# Altium footprint library bethu.PcbLib: 628 footprints (part 15 of 40)
Each footprint in its own frame and in the unit in brackets; x right, y up, seen from the top. Pads: shape width x height; smd on the part's side, far side on the other; paste and mask are expansions set on the pad; w line width, h text height; cw(c..) or ccw(c..) is an arc to the next point about the centre after c.
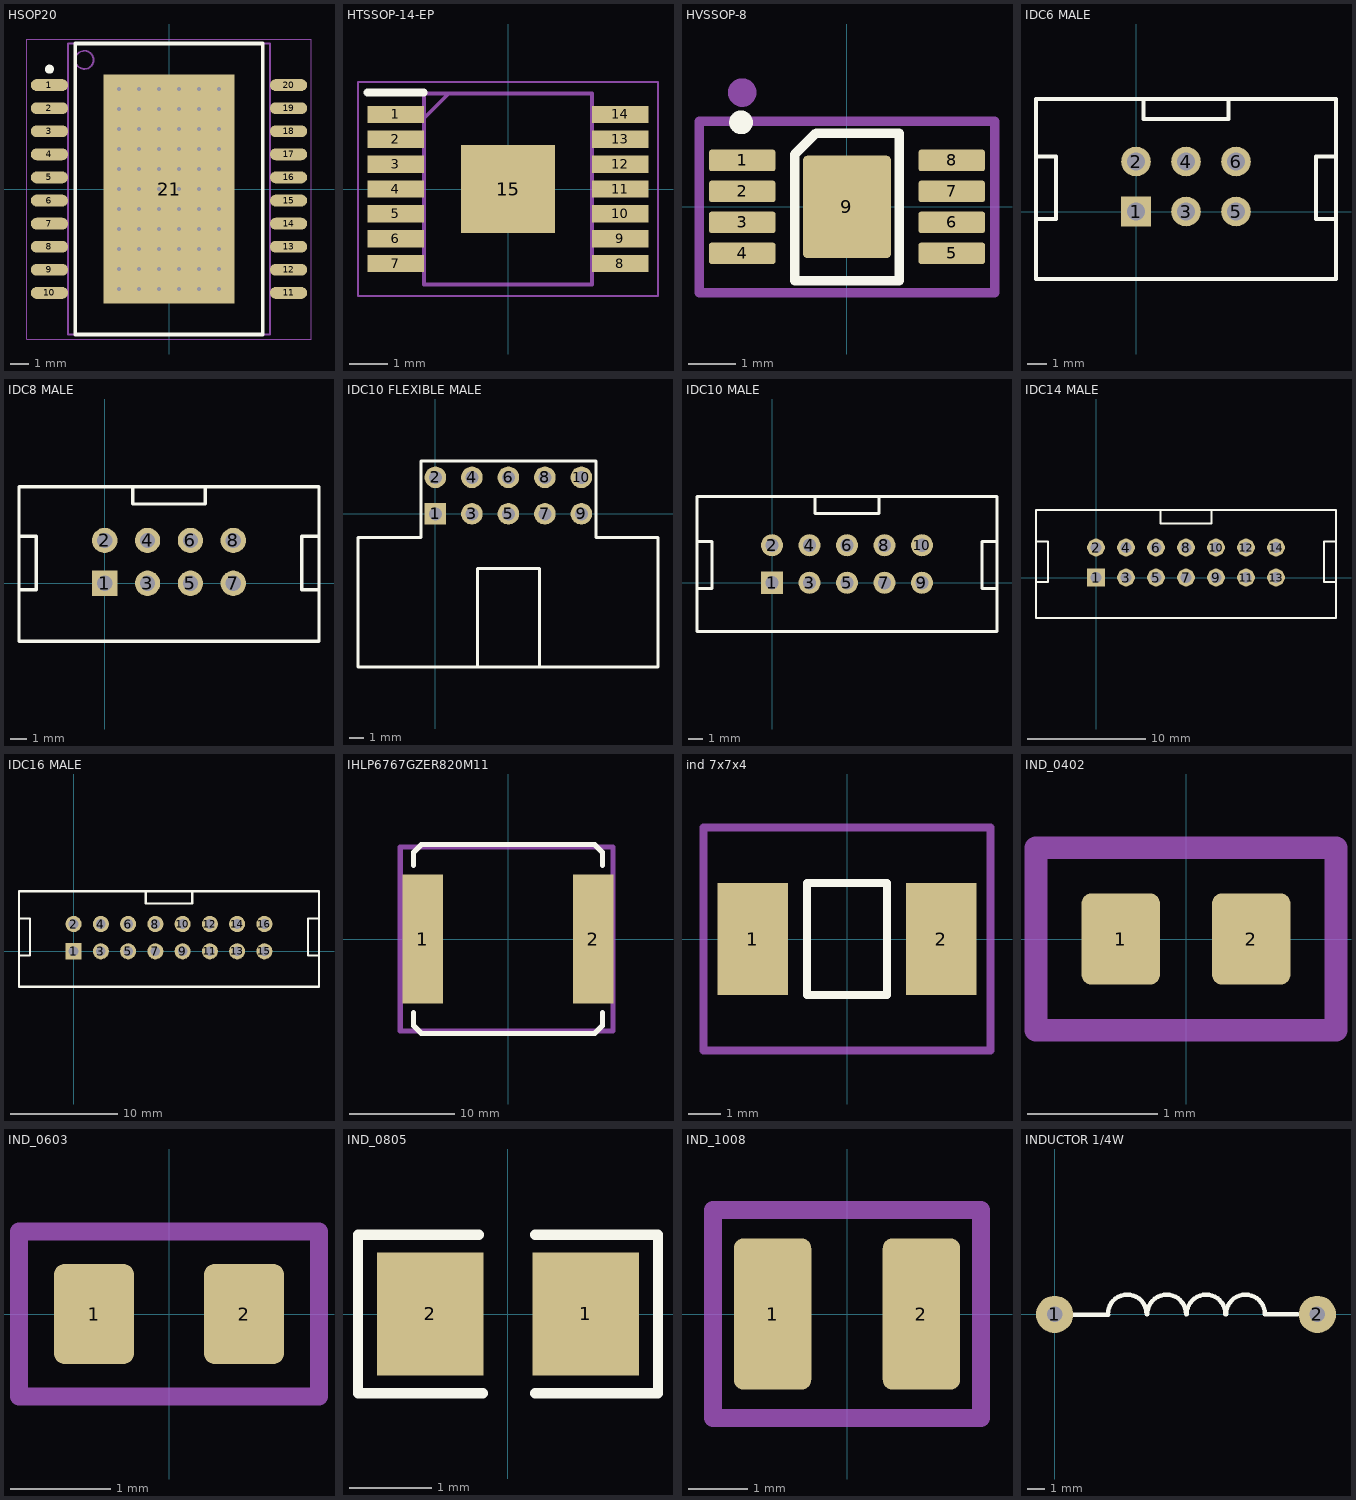
[diagram p14: the footprints below, top view; thin cyan lines are the x and y axes]

## HSOP20 [mm] "SOP, 20-Leads, Body 15.90x11.00mm, Pitch 1.27mm, Thermal Pad 12.60x7.20mm, IPC Medium Density"
height 3.4
pads (21):
  oval 2.05x0.65 smd: 1(-6.575,5.715) 2(-6.575,4.445) 3(-6.575,3.175) 4(-6.575,1.905) 5(-6.575,0.635) 6(-6.575,-0.635) 7(-6.575,-1.905) 8(-6.575,-3.175) 9(-6.575,-4.445) 10(-6.575,-5.715) 11(6.575,-5.715) 12(6.575,-4.445) 13(6.575,-3.175) 14(6.575,-1.905) 15(6.575,-0.635) 16(6.575,0.635) 17(6.575,1.905) 18(6.575,3.175) 19(6.575,4.445) 20(6.575,5.715)
  rect 7.2x12.6 smd: 21(0,0)
via 2.75,-5.5 diameter 0.5 hole 0.2
via 1.65,-5.5 diameter 0.5 hole 0.2
via 0.55,-5.5 diameter 0.5 hole 0.2
via -0.55,-5.5 diameter 0.5 hole 0.2
via -1.65,-5.5 diameter 0.5 hole 0.2
via -2.75,-5.5 diameter 0.5 hole 0.2
via 2.75,-4.4 diameter 0.5 hole 0.2
via 1.65,-4.4 diameter 0.5 hole 0.2
via 0.55,-4.4 diameter 0.5 hole 0.2
via -0.55,-4.4 diameter 0.5 hole 0.2
via -1.65,-4.4 diameter 0.5 hole 0.2
via -2.75,-4.4 diameter 0.5 hole 0.2
via 2.75,-3.3 diameter 0.5 hole 0.2
via 1.65,-3.3 diameter 0.5 hole 0.2
via 0.55,-3.3 diameter 0.5 hole 0.2
via -0.55,-3.3 diameter 0.5 hole 0.2
via -1.65,-3.3 diameter 0.5 hole 0.2
via -2.75,-3.3 diameter 0.5 hole 0.2
via 2.75,-2.2 diameter 0.5 hole 0.2
via 1.65,-2.2 diameter 0.5 hole 0.2
via 0.55,-2.2 diameter 0.5 hole 0.2
via -0.55,-2.2 diameter 0.5 hole 0.2
via -1.65,-2.2 diameter 0.5 hole 0.2
via -2.75,-2.2 diameter 0.5 hole 0.2
via 2.75,-1.1 diameter 0.5 hole 0.2
via 1.65,-1.1 diameter 0.5 hole 0.2
via 0.55,-1.1 diameter 0.5 hole 0.2
via -0.55,-1.1 diameter 0.5 hole 0.2
via -1.65,-1.1 diameter 0.5 hole 0.2
via -2.75,-1.1 diameter 0.5 hole 0.2
via 2.75,0 diameter 0.5 hole 0.2
via 1.65,0 diameter 0.5 hole 0.2
via 0.55,0 diameter 0.5 hole 0.2
via -0.55,0 diameter 0.5 hole 0.2
via -1.65,0 diameter 0.5 hole 0.2
via -2.75,0 diameter 0.5 hole 0.2
via 2.75,1.1 diameter 0.5 hole 0.2
via 1.65,1.1 diameter 0.5 hole 0.2
via 0.55,1.1 diameter 0.5 hole 0.2
via -0.55,1.1 diameter 0.5 hole 0.2
via -1.65,1.1 diameter 0.5 hole 0.2
via -2.75,1.1 diameter 0.5 hole 0.2
via 2.75,2.2 diameter 0.5 hole 0.2
via 1.65,2.2 diameter 0.5 hole 0.2
via 0.55,2.2 diameter 0.5 hole 0.2
via -0.55,2.2 diameter 0.5 hole 0.2
via -1.65,2.2 diameter 0.5 hole 0.2
via -2.75,2.2 diameter 0.5 hole 0.2
via 2.75,3.3 diameter 0.5 hole 0.2
via 1.65,3.3 diameter 0.5 hole 0.2
via 0.55,3.3 diameter 0.5 hole 0.2
via -0.55,3.3 diameter 0.5 hole 0.2
via -1.65,3.3 diameter 0.5 hole 0.2
via -2.75,3.3 diameter 0.5 hole 0.2
via 2.75,4.4 diameter 0.5 hole 0.2
via 1.65,4.4 diameter 0.5 hole 0.2
via 0.55,4.4 diameter 0.5 hole 0.2
via -0.55,4.4 diameter 0.5 hole 0.2
via -1.65,4.4 diameter 0.5 hole 0.2
via -2.75,4.4 diameter 0.5 hole 0.2
via 2.75,5.5 diameter 0.5 hole 0.2
via 1.65,5.5 diameter 0.5 hole 0.2
via 0.55,5.5 diameter 0.5 hole 0.2
via -0.55,5.5 diameter 0.5 hole 0.2
via -1.65,5.5 diameter 0.5 hole 0.2
via -2.75,5.5 diameter 0.5 hole 0.2
Top Overlay:
  circle w0.25: c-6.575,6.59 r0.125
  lines w0.2: -5.15,-8 5.15,-8 5.15,8 -5.15,8 -5.15,-8
Mechanical 13:
  circle w0.1: c-4.65,7.1 r0.5
  lines w0.1: -5.55,-8 5.55,-8 5.55,8 -5.55,8 -5.55,-8
Mechanical 15:
  lines w0.05: -7.825,-8.25 7.825,-8.25 7.825,8.25 -7.825,8.25 -7.825,-8.25
  lines w0.1: -0.5,0 0.5,0 ; 0,-0.5 0,0.5
3D body "User Library-HSOP_20pin_IC-MC33886PVW.STEP": height 3.2, standoff 0, extent -7.125,-8 7.125,8

## HTSSOP-14-EP [mm]
pads (15):
  rect 1.475x0.45 smd: 1(-2.938,1.95) 2(-2.938,1.3) 3(-2.938,0.65) 4(-2.938,0) 5(-2.938,-0.65) 6(-2.938,-1.3) 7(-2.938,-1.95) 8(2.938,-1.95) 9(2.938,-1.3) 10(2.938,-0.65) 11(2.938,0) 12(2.938,0.65) 13(2.938,1.3) 14(2.938,1.95)
  rect 2.46x2.31 smd: 15(0,0)
Top Overlay:
  lines w0.2: -3.675,2.525 -2.2,2.525
Mechanical 13:
  lines w0.1: -2.2,1.85 -1.55,2.5 ; -2.2,-2.5 -2.2,2.5 2.2,2.5 2.2,-2.5 -2.2,-2.5
  text "'.Designator'" at -5.84,-0.925 h1
Mechanical 15:
  lines w0.05: -3.925,-2.8 -3.925,2.8 3.925,2.8 3.925,-2.8 -3.925,-2.8
3D body "TPS54386TPWPRQ1.stp": height 1.13, standoff 0, extent -3.2,-2.5 3.2,2.5

## HVSSOP-8 [mm]
height 1.1
pads (9):
  rrect25% 1.4x0.45 smd: 1(-2.2,0.975) 2(-2.2,0.325) 3(-2.2,-0.325) 4(-2.2,-0.975) 5(2.2,-0.975) 6(2.2,-0.325) 7(2.2,0.325) 8(2.2,0.975)
  rrect10% 1.85x2.15 smd: 9(0,0)
Top Overlay:
  circle w0.25: c-2.225,1.775 r0.125
  lines w0.2: -1.1,-1.55 1.1,-1.55 1.1,1.55 -0.65,1.55 -1.1,1.1 -1.1,-1.55
Mechanical 13:
  circle w0.3: c-2.2,2.4 r0.15
  lines w0.2: -3.1,-1.8 -3.1,1.8 3.1,1.8 3.1,-1.8 -3.1,-1.8
  text "'.Designator'" at -5.815,-0.9 h1
Mechanical 15:
  lines w0.05: -3.15,-1.8 -3.15,1.8 3.15,1.8 3.15,-1.8 -3.15,-1.8
  lines w0.1: -0.5,0 0.5,0 ; 0,-0.5 0,0.5
3D body "HVSSOP-8.step": height 1.1, standoff 0, extent -2.45,-1.55 2.45,1.55

## IDC6 MALE [mm] "Connector; Header; 3x2 Position"
pads (6):
  rect 1.5x1.5 hole 0.9: 1(0,0)
  round 1.5 hole 0.9: 2(0,2.54) 3(2.54,0) 4(2.54,2.54) 5(5.08,0) 6(5.08,2.54)
Top Overlay:
  lines w0.2: -5.08,-0.381 -4.064,-0.381 -4.064,2.794 -5.08,2.794 ; 0.381,5.715 0.381,4.699 4.699,4.699 4.699,5.715 ; 10.16,-0.381 9.144,-0.381 9.144,2.794 10.16,2.794 ; -5.08,-3.429 10.16,-3.429 10.16,5.715 -5.08,5.715 -5.08,-3.429
3D body "65714.stp": height 9.13, standoff -2.98, extent -5.1,-3.405 10.18,5.695

## IDC8 MALE [mm] "Connector; Header; 4x2 Position"
pads (8):
  rect 1.5x1.5 hole 0.9: 1(0,0)
  round 1.5 hole 0.9: 2(0,2.54) 3(2.54,0) 4(2.54,2.54) 5(5.08,0) 6(5.08,2.54) 7(7.62,0) 8(7.62,2.54)
Top Overlay:
  lines w0.2: -5.08,-0.381 -4.064,-0.381 -4.064,2.794 -5.08,2.794 ; 1.651,5.715 1.651,4.699 5.969,4.699 5.969,5.715 ; 12.7,-0.381 11.684,-0.381 11.684,2.794 12.7,2.794 ; -5.08,-3.429 -5.08,5.715 12.7,5.715 12.7,-3.429 -5.08,-3.429
3D body "65718.stp": height 9.13, standoff -2.98, extent -5.1,-3.405 12.72,5.695

## IDC10 FLEXIBLE MALE [mm] "Connector; Header; 5x2 Position"
pads (10):
  rect 1.5x1.5 hole 0.9: 1(0,0)
  round 1.5 hole 0.9: 2(0,2.54) 3(2.54,0) 4(2.54,2.54) 5(5.08,0) 6(5.08,2.54) 7(7.62,0) 8(7.62,2.54) 9(10.16,0) 10(10.16,2.54)
Top Overlay:
  lines w0.199: -5.39,-2.667 -5.39,-1.651 ; -1.016,3.683 11.176,3.683
  lines w0.2: -5.39,-2.667 -5.39,-10.668 15.494,-10.668 15.494,-1.651 11.176,-1.651 11.176,3.683 ; -5.39,-1.651 -1.016,-1.651 -1.016,3.683 ; 2.921,-10.668 2.921,-3.81 7.239,-3.81 7.239,-10.668
3D body "User Library-IDC Socket Male 10pin Angled THT Goldplated 2_54mm.STEP": height 8.98, standoff -2.37, extent -5.39,-10.639 15.55,2.921

## IDC10 MALE [mm] "Connector; Header; 5x2 Position"
pads (10):
  rect 1.5x1.5 hole 0.9: 1(0,0)
  round 1.5 hole 0.9: 2(0,2.54) 3(2.54,0) 4(2.54,2.54) 5(5.08,0) 6(5.08,2.54) 7(7.62,0) 8(7.62,2.54) 9(10.16,0) 10(10.16,2.54)
Top Overlay:
  lines w0.2: -5.08,-0.381 -4.064,-0.381 -4.064,2.794 -5.08,2.794 ; 2.921,5.842 2.921,4.699 7.239,4.699 7.239,5.842 ; 15.24,-0.381 14.224,-0.381 14.224,2.794 15.24,2.794 ; -5.08,-3.302 15.24,-3.302 15.24,5.842 -5.08,5.842 -5.08,-3.302
3D body "User Library-BH_10_V.STEP": height 9, standoff -3, extent -5.08,-3.28 15.24,5.82

## IDC14 MALE [mm] "Connector; Header; 7x2 Position"
pads (14):
  rect 1.5x1.5 hole 0.9: 1(0,0)
  round 1.5 hole 0.9: 2(0,2.54) 3(2.54,0) 4(2.54,2.54) 5(5.08,0) 6(5.08,2.54) 7(7.62,0) 8(7.62,2.54) 9(10.16,0) 10(10.16,2.54) 11(12.7,0) 12(12.7,2.54) 13(15.24,0) 14(15.24,2.54)
Top Overlay:
  lines w0.2: -5.08,-0.381 -4.064,-0.381 -4.064,3.048 -5.08,3.048 ; 5.461,5.715 5.461,4.572 9.779,4.572 9.779,5.715 ; 20.32,-0.381 19.304,-0.381 19.304,3.048 20.32,3.048 ; -5.08,-3.429 20.32,-3.429 20.32,5.715 -5.08,5.715 -5.08,-3.429
3D body "65724.stp": height 8.93, standoff -3.17, extent -5.08,-3.407 20.36,5.693

## IDC16 MALE [mm] "Connector; Header; 8x2 Position"
pads (16):
  rect 1.5x1.5 hole 0.9: 1(0,0)
  round 1.5 hole 0.9: 2(0,2.54) 3(2.54,0) 4(2.54,2.54) 5(5.08,0) 6(5.08,2.54) 7(7.62,0) 8(7.62,2.54) 9(10.16,0) 10(10.16,2.54) 11(12.7,0) 12(12.7,2.54) 13(15.24,0) 14(15.24,2.54) 15(17.78,0) 16(17.78,2.54)
Top Overlay:
  lines w0.2: -5.08,-0.381 -4.064,-0.381 -4.064,3.048 -5.08,3.048 ; 6.731,5.588 6.731,4.445 11.049,4.445 11.049,5.588 ; 22.86,-0.381 21.844,-0.381 21.844,3.048 22.86,3.048 ; -5.08,-3.302 -5.08,5.588 22.86,5.588 22.86,-3.302 -5.08,-3.302
3D body "User Library-IDC Socket Male 16pin Straight THT Goldplated 2_54mm.STEP": height 8.93, standoff -3.47, extent -5.07,-3.33 22.85,5.52

## IHLP6767GZER820M11 [mm]
pads (2):
  rect 3.825x12.32 smd: 1(-8.12,0) 2(8.12,0)
Top Overlay:
  lines w0.5: -9,-7 -9,-8.25 -8.25,-9 8.25,-9 9,-8.25 9,-7 ; -9,7 -9,8.25 -8.25,9 8.25,9 9,8.25 9,7
Mechanical 13:
  lines w0.5: -10.25,-8.75 10,-8.75 10,8.75 -10.25,8.75 -10.25,-8.75
  text "'.Designator'" at -5.665,-0.417 h1
3D body "IHLP-6767GZ-11.STEP": height 7.01, standoff 0.01, extent -8.575,-8.575 8.575,8.575

## ind 7x7x4 [mm]
pads (2):
  rect 2.2x3.5 smd: 1(-2.95,0) 2(2.95,0)
Top Overlay:
  lines w0.25: -1.25,-1.75 1.25,-1.75 1.25,1.75 -1.25,1.75 -1.25,-1.75
Mechanical 13:
  lines w0.25: -4.5,-3.5 -4.5,3.5 4.5,3.5 4.5,-3.5 -4.5,-3.5
  text "'.Designator'" at -5.815,-0.9 h1
3D body "MWSA0603S.STEP": height 2.8, standoff 0, extent -3.6,-3.3 3.6,3.3

## IND_0402 [mm]
pads (2):
  rrect25% 0.6x0.7 smd: 1(-0.5,0) 2(0.5,0)
Mechanical 13:
  lines w0.175: -1.15,-0.7 1.15,-0.7 1.15,0.7 -1.15,0.7 -1.15,-0.7
  text "'.Designator'" at -5.665,-0.417 h1
3D body "L0402.step": height 0.67, standoff 0.01, extent -0.56,-0.256 0.56,0.256

## IND_0603 [mm]
pads (2):
  rrect25% 0.8x1 smd: 1(-0.75,0) 2(0.75,0)
Mechanical 13:
  lines w0.175: -1.5,-0.825 1.5,-0.825 1.5,0.825 -1.5,0.825 -1.5,-0.825
  text "'.Designator'" at -5.665,-0.417 h1
3D body "L0603.step": height 0.87, standoff 0.01, extent -0.81,-0.365 0.81,0.365

## IND_0805 [mm] "Ferrite Bead"
height 0.65
pads (2):
  rect 1.3x1.5 smd mask+0.076: 1(0.95,0) 2(-0.95,0)
Top Overlay:
  lines w0.127: -0.356,0.965 -1.829,0.965 -1.829,-0.965 -0.305,-0.965 ; 0.33,-0.965 1.829,-0.965 1.829,0.965 0.33,0.965
3D body "RES0805.stp": height 0.5, standoff 0, extent -1,-0.63 1,0.62

## IND_1008 [mm]
pads (2):
  rrect25% 1.3x2.54 smd: 1(-1.25,0) 2(1.25,0)
Mechanical 13:
  lines w0.3: -2.25,-1.75 2.25,-1.75 2.25,1.75 -2.25,1.75 -2.25,-0.25 -2.25,-1.75
  text "'.Designator'" at -5.84,-0.925 h1
3D body "L1008.stp": height 1.71, standoff -0.09, extent -1.3,-1.05 1.3,1.05

## INDUCTOR 1/4W [mil]
height 50
pads (2):
  round 85 hole 35: 1(0,0) 2(600,0)
Top Overlay:
  lines w10: 42,-1 122.05,-1 ; 121.64,-0.03 cw(c165.82,0.91) 210,0 ; 211.64,-0.03 cw(c255.82,0.91) 300,0 ; 301.64,-0.03 cw(c345.82,0.91) 390,0 ; 391.64,-0.03 cw(c435.82,0.91) 480,0 ; 480.31,0 555,0
3D body "User Library-Indutor 100uH-370mA-600mil.STEP": height 138.04, standoff -78.74, extent -13.78,-72.29 613.78,72.3